# Altium footprint library lib_datalogger.PcbLib: 866 footprints (part 8 of 55)
Each footprint in its own frame and in the unit in brackets; x right, y up, seen from the top. Pads: shape width x height; smd on the part's side, far side on the other; paste and mask are expansions set on the pad; w line width, h text height; cw(c..) or ccw(c..) is an arc to the next point about the centre after c.
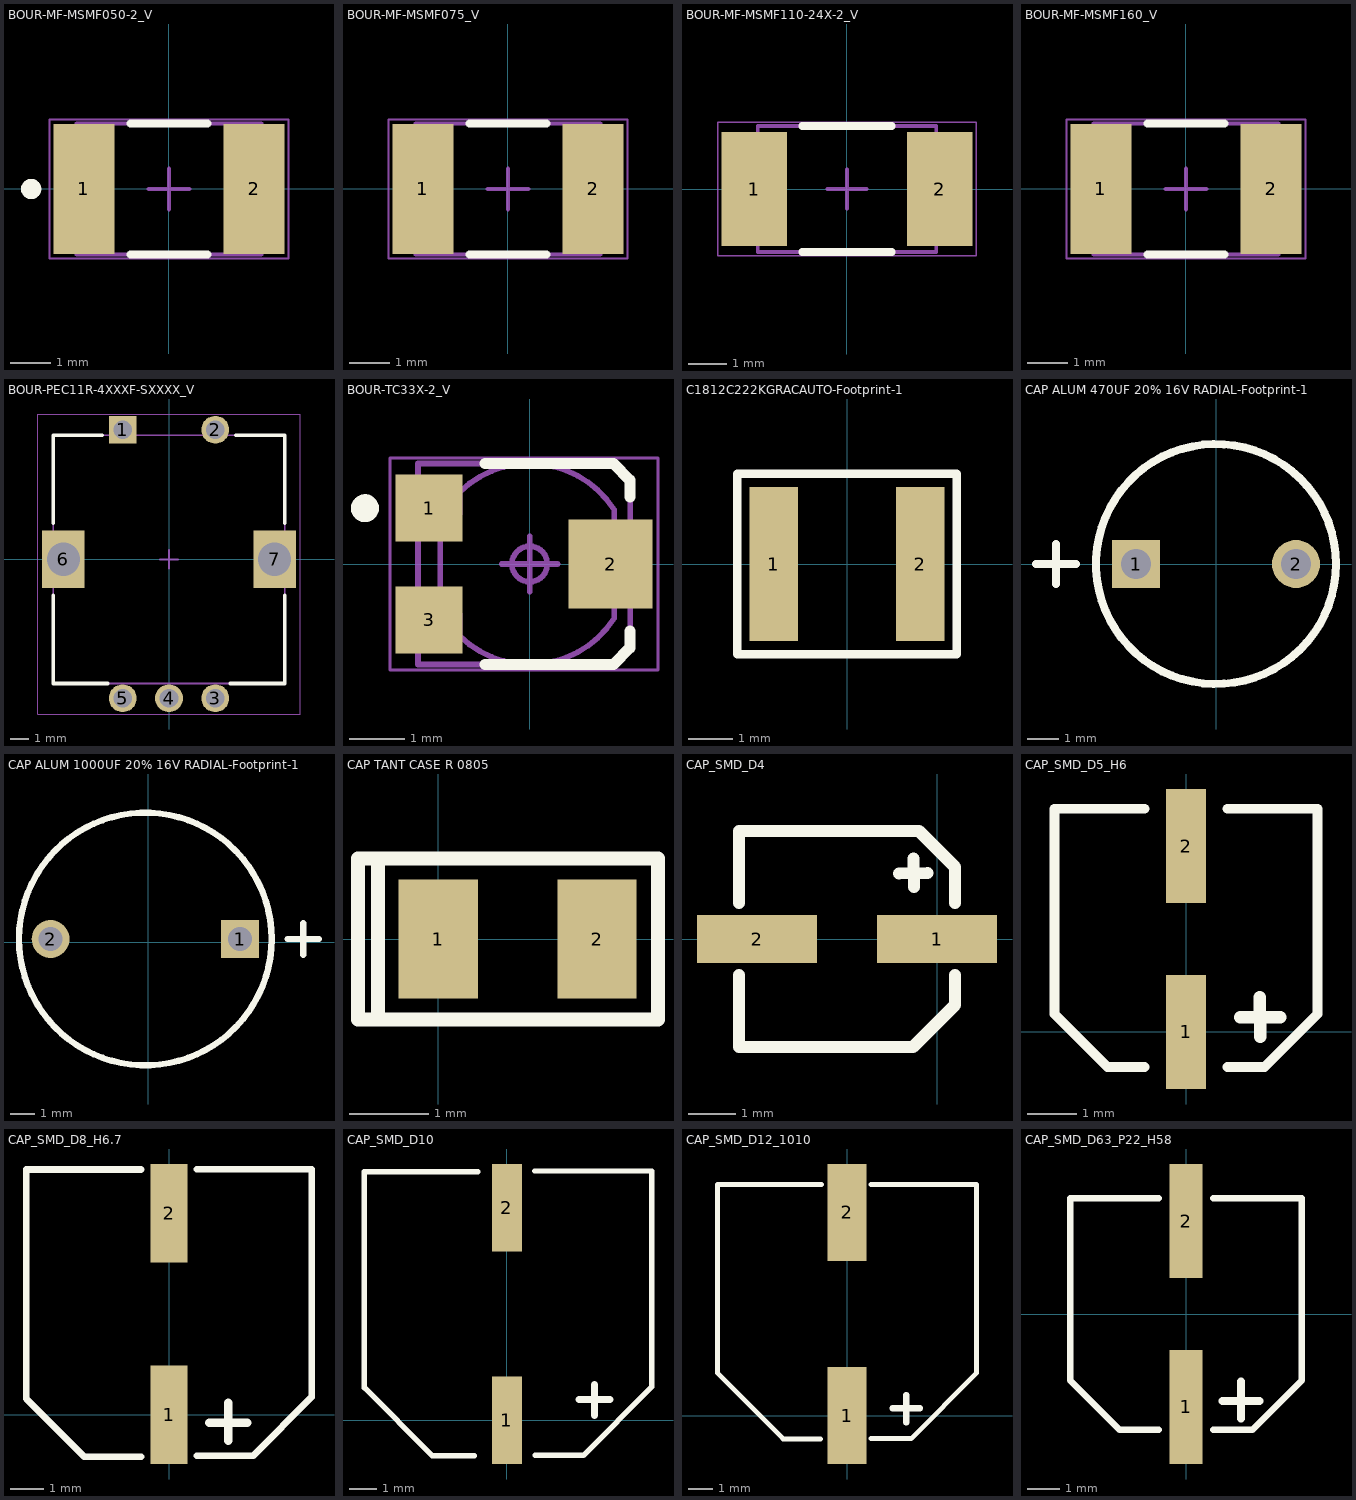
[diagram p7: the footprints below, top view; thin cyan lines are the x and y axes]

## BOUR-MF-MSMF050-2_V [mm] "SMD, 2-Leads, Body 4.55x3.24mm"
height 0.85
pads (2):
  rect 1.5x3.2 smd: 1(-2.1,0) 2(2.1,0)
Top Overlay:
  circle w0.25: c-3.4,0 r0.125
  lines w0.2: -0.95,-1.62 0.95,-1.62 ; -0.95,1.62 0.95,1.62
Mechanical 13:
  lines w0.1: -2.275,-1.62 -2.275,-0.497 ccw(c-2.275,0) -2.275,0.497 -2.275,1.62 2.275,1.62 2.275,0.497 ccw(c2.275,0) 2.275,-0.497 2.275,-1.62 -2.275,-1.62
Mechanical 15:
  lines w0.05: -2.95,-1.72 -2.95,1.72 2.95,1.72 2.95,-1.72 -2.95,-1.72
  lines w0.1: -0.5,0 0.5,0 ; 0,-0.5 0,0.5
3D body: height 0.85, standoff 0, extent -1.575,-1.62 1.575,1.62
3D body: height 0.85, standoff 0, extent 1.575,-1.62 2.275,1.62
3D body: height 0.85, standoff 0, extent -2.275,-1.62 -1.575,1.62

## BOUR-MF-MSMF075_V [mm] "SMD, 2-Leads, Body 4.55x3.24mm"
height 0.85
pads (2):
  rect 1.5x3.2 smd: 1(-2.1,0) 2(2.1,0)
Top Overlay:
  lines w0.2: -0.95,-1.62 0.95,-1.62 ; -0.95,1.62 0.95,1.62
Mechanical 13:
  lines w0.1: -2.275,-1.62 2.275,-1.62 ; -2.275,-1.62 -2.275,1.62 2.275,1.62 2.275,-1.62
Mechanical 15:
  lines w0.05: -2.95,-1.72 2.95,-1.72 2.95,1.72 -2.95,1.72 -2.95,-1.72
  lines w0.1: -0.5,0 0.5,0 ; 0,-0.5 0,0.5
3D body "mf-msmf075.stp": height 0.7, standoff 0, extent -2.275,-1.62 2.275,1.62

## BOUR-MF-MSMF110-24X-2_V [mm] "Chip Fuse, 2-Leads, Body 4.6x3.24mm"
height 1.6
pads (2):
  rect 1.68x2.95 smd: 1(-2.39,0) 2(2.39,0)
Top Overlay:
  lines w0.2: -1.15,-1.62 1.15,-1.62 ; -1.15,1.62 1.15,1.62
Mechanical 13:
  lines w0.1: -2.3,-1.62 -2.3,1.62 2.3,1.62 2.3,-1.62 -2.3,-1.62
Mechanical 15:
  lines w0.05: -3.33,-1.72 3.33,-1.72 3.33,1.72 -3.33,1.72 -3.33,-1.72
  lines w0.1: -0.5,0 0.5,0 ; 0,-0.5 0,0.5
3D body "mf-msmf110_24x.stp": height 1.15, standoff 0, extent -2.3,-1.62 2.3,1.62

## BOUR-MF-MSMF160_V [mm] "SMD, 2-Leads, Body 4.55x3.24mm"
height 0.85
pads (2):
  rect 1.5x3.2 smd: 1(-2.1,0) 2(2.1,0)
Top Overlay:
  lines w0.2: -0.95,-1.62 0.95,-1.62 ; -0.95,1.62 0.95,1.62
Mechanical 13:
  lines w0.1: -2.275,-1.62 2.275,-1.62 ; -2.275,-1.62 -2.275,1.62 2.275,1.62 2.275,-1.62
Mechanical 15:
  lines w0.05: -2.95,-1.72 2.95,-1.72 2.95,1.72 -2.95,1.72 -2.95,-1.72
  lines w0.1: -0.5,0 0.5,0 ; 0,-0.5 0,0.5
3D body "mf-msmf160.stp": height 0.7, standoff 0, extent -2.275,-1.62 2.275,1.62

## BOUR-PEC11R-4XXXF-SXXXX_V [mm] "THD, 5-Leads, Body 12.5x13.4mm"
height 22
pads (7):
  rect 1.5x1.5 hole 1: 1(-2.5,7)
  round 1.5 hole 1: 2(2.5,7) 3(2.5,-7.5) 4(0,-7.5) 5(-2.5,-7.5)
  rect 2.3x3.1 hole 1.8 square: 6(-5.7,0) 7(5.7,0)
Top Overlay:
  lines w0.2: -6.25,-1.95 -6.25,-6.7 -3.326,-6.7 ; -6.25,1.95 -6.25,6.7 -3.61,6.7 ; 3.326,-6.7 6.25,-6.7 6.25,-1.95 ; 3.61,6.7 6.25,6.7 6.25,1.95
Mechanical 13:
  lines w0.1: -6.25,-6.7 6.25,-6.7 6.25,6.7 -6.25,6.7 -6.25,-6.7
Mechanical 15:
  lines w0.05: -7.1,-8.35 7.1,-8.35 7.1,7.85 -7.1,7.85 -7.1,-8.35
  lines w0.1: -0.5,0 0.5,0 ; 0,-0.5 0,0.5
3D body "pec11r-4x15f-sxxxx.stp": height 21.61, standoff -3.59, extent -7,-7.7 7,7.2

## BOUR-TC33X-2_V [mm] "SMD, 3-Leads, Body 3.8x3.6mm"
height 1.2
pads (3):
  rect 1.2x1.2 smd: 1(-1.8,1) 3(-1.8,-1)
  rect 1.5x1.6 smd: 2(1.45,0)
Top Overlay:
  circle w0.25: c-2.95,1 r0.125
  lines w0.2: -0.8,-1.8 1.5,-1.8 1.8,-1.5 1.8,-1.2 ; -0.8,1.8 1.5,1.8 1.8,1.5 1.8,1.2
Mechanical 13:
  lines w0.1: 1.515,-0.73 1.95,-0.73 1.95,-0.425 1.8,-0.425 ; 1.515,0.73 1.95,0.73 1.95,0.425 1.8,0.425 ; 1.8,-0.75 1.8,-1.5 1.5,-1.8 -2,-1.8 -2,1.8 1.5,1.8 1.8,1.5 1.8,0.75 ; 1.8,-0.42 1.8,0.42 ; -1.6,-0.895 -1.25,-0.895 -1.25,-1.295 ccw(c0,0) 1.515,-0.972 1.515,-0.352 ccw(c1.16,0) 1.515,0.352 1.515,0.972 ccw(c0,0) -1.25,1.295 -1.25,0.895 -1.6,0.895 -1.6,-0.895 ; 0,-0.318 cw(c0,0) 0,0.317 cw(c0,0) 0,-0.318
Mechanical 15:
  lines w0.05: -2.5,-1.9 2.3,-1.9 2.3,1.9 -2.5,1.9 -2.5,-1.9
  lines w0.1: -0.5,0 0.5,0 ; 0,-0.5 0,0.5
3D body "BOUR-TC33X-2.stp": height 1.15, standoff 0, extent -2,-1.8 1.963,1.8

## C1812C222KGRACAUTO-Footprint-1 [mm]
pads (2):
  rect 1.11x3.5 smd: 1(-1.667,0) 2(1.667,0)
Top Overlay:
  lines w0.2: -2.5,-2.057 -2.5,2.057 2.5,2.057 2.5,-2.057 -2.5,-2.057
3D body "1812HC222KAT1A.stp": height 2.8, standoff 0, extent -2.3,-1.6 2.3,1.6

## CAP ALUM 470UF 20% 16V RADIAL-Footprint-1 [mil]
pads (2):
  rect 60x60 hole 38: 1(-100,0)
  round 60 hole 38: 2(100,0)
Top Overlay:
  circle w10: c0,0 r150
  lines w10: -225,0 -175,0 ; -200,-25 -200,25
3D body: height 450, standoff 50, extent -135,-135 135,135
3D body: height 200, standoff -200, extent 90,-10 110,10
3D body: height 200, standoff -200, extent -110,-10 -90,10

## CAP ALUM 1000UF 20% 16V RADIAL-Footprint-1 [mil]
pads (2):
  rect 60x60 hole 38: 1(145,5)
  round 60 hole 38: 2(-155,5)
Top Overlay:
  circle w10: c-5,5 r200
  lines w10: 220,5 270,5 ; 245,-20 245,30
3D body "esc108m016ah4aa.stp": height 900.2, standoff -753.54, extent -217.23,-217.23 217.23,217.23

## CAP TANT CASE R 0805 [mm] "0.081\" L x 0.051\" W (2.05mm x 1.30mm)"
height 0.2
pads (2):
  rect 1x1.5 smd: 1(0,0) 2(2,0)
Top Overlay:
  lines w0.178: -0.762,-1.016 -0.762,1.016 ; -1.013,-1.016 -1.013,1.016 2.769,1.016 2.769,-1.016 -1.013,-1.016
3D body "Tantalum Capacitor Case R.STEP": height 1.35, standoff 0, extent -0.125,-0.675 2.125,0.675

## CAP_SMD_D4 [mil]
pads (2):
  rect 100x40 smd: 1(0,0) 2(-150,0)
Top Overlay:
  lines w10: -165,-30 -165,-90 -20,-90 15,-55 15,-30 ; -165,30 -165,90 -25,90 -15,90 15,60 15,30 ; -31.49,54.71 -7.87,55.12 ; -19.68,66.93 -19.15,43.32
3D body "User Library-ALU-B.STEP": height 212.6, standoff 0, extent -165.55,-84.65 15.55,84.65

## CAP_SMD_D5_H6 [mm]
pads (2):
  rect 0.8x2.3 smd: 1(0,0) 2(0,3.751)
Top Overlay:
  lines w0.2: -0.838,-0.704 -1.582,-0.704 -2.65,0.364 -2.65,4.503 -0.838,4.503 ; 0.838,-0.704 1.582,-0.704 2.65,0.364 2.65,4.503 0.838,4.503
  lines w0.254: 1.1,0.3 1.9,0.3 ; 1.488,0.7 1.5,-0.1
3D body "User Library-ALU-C.STEP": height 5.41, standoff 0, extent -2.65,-1.075 2.65,4.825

## CAP_SMD_D8_H6.7 [mm]
pads (2):
  rect 1.1x2.95 smd: 1(0,0) 2(0,6.05)
Top Overlay:
  lines w0.2: -0.838,-1.26 -2.54,-1.26 -4.28,0.48 -4.28,7.36 -0.838,7.36 ; 0.838,-1.23 2.52,-1.23 4.28,0.53 4.28,7.37 0.838,7.37
  lines w0.254: 1.208,-0.24 2.347,-0.24 ; 1.775,-0.776 1.775,0.364
3D body "User Library-A3D-003-00013.STEP": height 6.2, standoff 0, extent -4.14,-1.47 4.16,7.53

## CAP_SMD_D10 [mm]
pads (2):
  rect 1.1x3.2 smd: 1(0,0) 2(0,7.8)
Top Overlay:
  lines w0.2: -1.202,-1.292 -2.74,-1.292 -5.232,1.201 -5.232,9.119 -1.075,9.119 ; 1.025,9.144 5.309,9.144 5.309,1.23 2.798,-1.28 1.041,-1.28
  lines w0.254: 2.642,0.76 3.781,0.76 ; 3.209,0.174 3.209,1.313
3D body "EEE-FK1H221P.STEP": height 10.25, standoff 0.05, extent -5.131,-1.845 5.169,9.855

## CAP_SMD_D12_1010 [mm]
pads (2):
  rect 1.6x4 smd: 1(0,0) 2(0,8.4)
Top Overlay:
  lines w0.2: -1.1,-0.961 -2.639,-0.961 -5.35,1.75 -5.35,9.55 -1.05,9.55 ; 0.988,-0.95 2.65,-0.95 5.35,1.75 5.35,9.55 0.988,9.55
  lines w0.254: 1.88,0.302 3.019,0.302 ; 2.447,-0.283 2.447,0.856
3D body "VE-102M1CTR-1010.stp": height 10.5, standoff 0, extent -5.3,-1.4 5.2,9.8

## CAP_SMD_D63_P22_H58 [mm]
pads (2):
  rect 1x3.5 smd: 1(0,-2.852) 2(0,2.852)
Top Overlay:
  lines w0.2: -0.838,-3.556 -2.032,-3.556 -3.556,-2.032 -3.556,3.556 -0.838,3.556 ; 0.838,-3.556 2.032,-3.556 3.556,-2.032 3.556,3.556 0.838,3.556
  lines w0.254: 1.118,-2.672 2.257,-2.672 ; 1.685,-3.208 1.685,-2.069
3D body "User Library-CAPSMD6_3x3_9.STEP": height 3.91, standoff 0, extent -3.3,-3.538 3.3,3.462